# Altium footprint library HARTING THD.PcbLib: 113 footprints (part 8 of 11)
Each footprint in its own frame and in the unit in brackets; x right, y up, seen from the top. Pads: shape width x height; smd on the part's side, far side on the other; paste and mask are expansions set on the pad; w line width, h text height; cw(c..) or ccw(c..) is an arc to the next point about the centre after c.
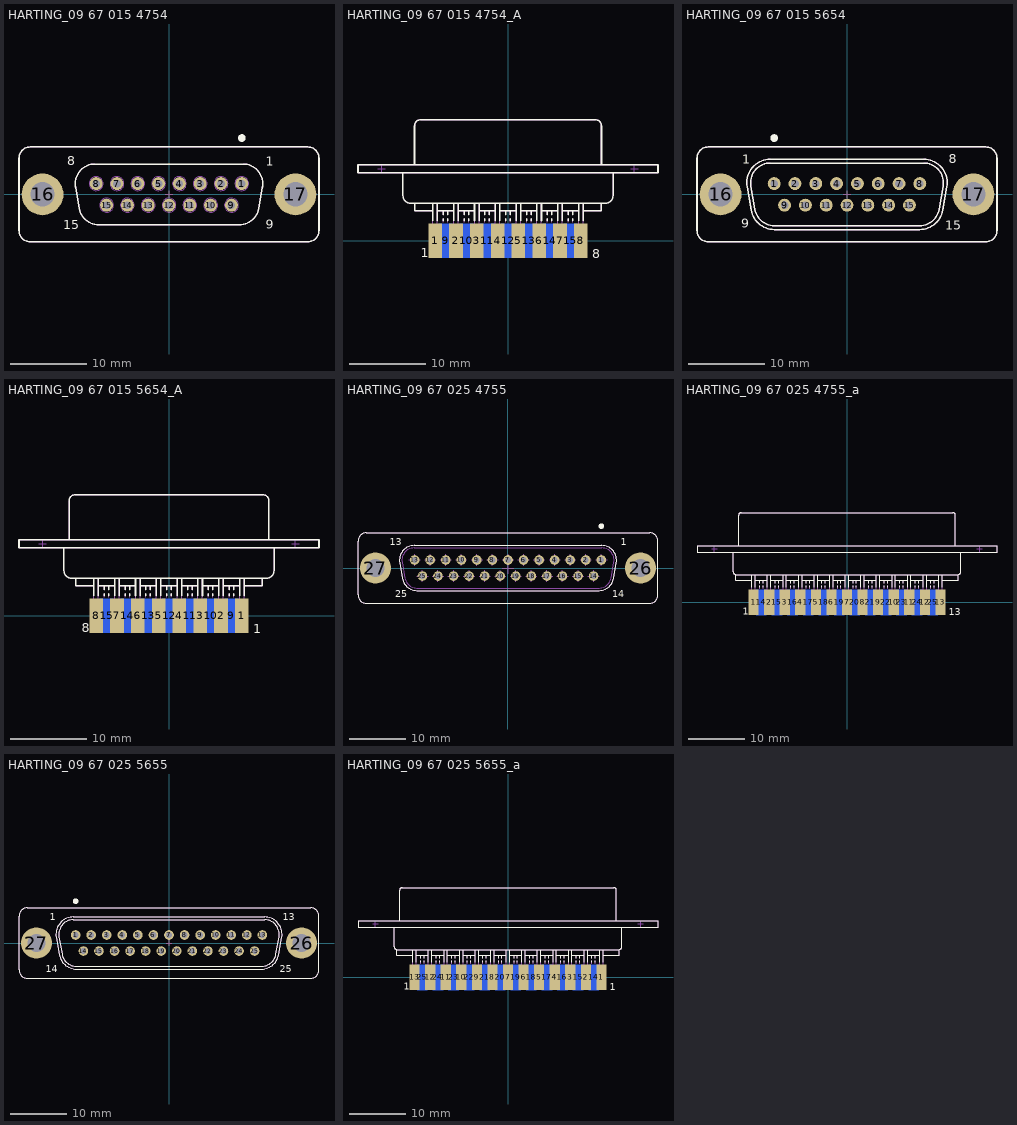
[diagram p7: the footprints below, top view; thin cyan lines are the x and y axes]

## HARTING_09 67 015 4754 [mm] "Straight D-SUB 15 Female Contacts"
height 12
pads (17):
  round 1.7 hole 1: 1(9.59,1.42) 2(6.85,1.42) 3(4.11,1.42) 4(1.37,1.42) 5(-1.37,1.42) 6(-4.11,1.42) 7(-6.85,1.42) 8(-9.59,1.42) 9(8.22,-1.42) 10(5.48,-1.42) 11(2.74,-1.42) 12(0,-1.42) 13(-2.74,-1.42) 14(-5.48,-1.42) 15(-8.22,-1.42)
  round 5.5 hole 3.2: 16(-16.65,0) 17(16.65,0)
Top Overlay:
  circle w0.5: c9.59,7.42 r0.25
  lines w0.2: -19.75,-4.75 ccw(c-18.25,-4.75) -18.25,-6.25 18.25,-6.25 ccw(c18.25,-4.75) 19.75,-4.75 19.75,4.75 ccw(c18.25,4.75) 18.25,6.25 -18.25,6.25 ccw(c-18.25,4.75) -19.75,4.75 -19.75,-4.75 ; -12.311,0.949 cw(c-9.75,1.4) -9.75,4 9.75,4 cw(c9.75,1.4) 12.311,0.949 11.817,-1.851 cw(c9.256,-1.4) 9.256,-4 -9.256,-4 cw(c-9.256,-1.4) -11.817,-1.851 -12.311,0.949
  text "15" at -13.9,-4.6 h1.2
  text "8" at -13.375,3.825 h1.2
  text "1" at 12.76,3.748 h1.2
  text "9" at 12.725,-4.55 h1.2
Mechanical 8:
  lines w0.1: -17.15,0 -16.65,0 ; -16.65,-0.5 -16.65,0 ; -16.65,0.5 -16.65,0 ; -16.15,0 -16.65,0 ; -10.09,1.42 -9.59,1.42 ; -9.59,0.92 -9.59,1.42 ; -9.59,1.92 -9.59,1.42 ; -9.09,1.42 -9.59,1.42 ; -8.72,-1.42 -8.22,-1.42 ; -8.22,-1.92 -8.22,-1.42 ; -8.22,-0.92 -8.22,-1.42 ; -7.72,-1.42 -8.22,-1.42 ; -7.35,1.42 -6.85,1.42 ; -6.85,0.92 -6.85,1.42 ; -6.85,1.92 -6.85,1.42 ; -6.35,1.42 -6.85,1.42 ; -5.98,-1.42 -5.48,-1.42 ; -5.48,-1.92 -5.48,-1.42 ; -5.48,-0.92 -5.48,-1.42 ; -4.98,-1.42 -5.48,-1.42 ; -4.61,1.42 -4.11,1.42 ; -4.11,0.92 -4.11,1.42 ; -4.11,1.92 -4.11,1.42 ; -3.61,1.42 -4.11,1.42 ; -3.24,-1.42 -2.74,-1.42 ; -2.74,-1.92 -2.74,-1.42 ; -2.74,-0.92 -2.74,-1.42 ; -2.24,-1.42 -2.74,-1.42 ; -1.87,1.42 -1.37,1.42 ; -1.37,0.92 -1.37,1.42 ; -1.37,1.92 -1.37,1.42 ; -0.87,1.42 -1.37,1.42 ; -0.5,-1.42 0,-1.42 ; -0.5,0 0,0 ; 0,-1.92 0,-1.42 ; 0,-0.92 0,-1.42 ; 0,-0.5 0,0 ; 0,0.5 0,0 ; 0.5,-1.42 0,-1.42 ; 0.5,0 0,0 ; 0.87,1.42 1.37,1.42 ; 1.37,0.92 1.37,1.42 ; 1.37,1.92 1.37,1.42 ; 1.87,1.42 1.37,1.42 ; 2.24,-1.42 2.74,-1.42 ; 2.74,-1.92 2.74,-1.42 ; 2.74,-0.92 2.74,-1.42 ; 3.24,-1.42 2.74,-1.42 ; 3.61,1.42 4.11,1.42 ; 4.11,0.92 4.11,1.42 ; 4.11,1.92 4.11,1.42 ; 4.61,1.42 4.11,1.42 ; 4.98,-1.42 5.48,-1.42 ; 5.48,-1.92 5.48,-1.42 ; 5.48,-0.92 5.48,-1.42 ; 5.98,-1.42 5.48,-1.42 ; 6.35,1.42 6.85,1.42 ; 6.85,0.92 6.85,1.42 ; 6.85,1.92 6.85,1.42 ; 7.35,1.42 6.85,1.42 ; 7.72,-1.42 8.22,-1.42 ; 8.22,-1.92 8.22,-1.42 ; 8.22,-0.92 8.22,-1.42 ; 8.72,-1.42 8.22,-1.42 ; 9.09,1.42 9.59,1.42 ; 9.59,0.92 9.59,1.42 ; 9.59,1.92 9.59,1.42 ; 10.09,1.42 9.59,1.42 ; 16.15,0 16.65,0 ; 16.65,-0.5 16.65,0 ; 16.65,0.5 16.65,0 ; 17.15,0 16.65,0
Mechanical 14:
  circle w0.1: c-8.22,-1.42 r0.55
  circle w0.1: c-5.48,-1.42 r0.55
  circle w0.1: c-2.74,-1.42 r0.55
  circle w0.1: c0,-1.42 r0.55
  circle w0.1: c2.74,-1.42 r0.55
  circle w0.1: c5.48,-1.42 r0.55
  circle w0.1: c8.22,-1.42 r0.55
  circle w0.1: c9.59,1.42 r0.55
  circle w0.1: c6.85,1.42 r0.55
  circle w0.1: c4.11,1.42 r0.55
  circle w0.1: c1.37,1.42 r0.55
  circle w0.1: c-1.37,1.42 r0.55
  circle w0.1: c-4.11,1.42 r0.55
  circle w0.1: c-6.85,1.42 r0.55
  circle w0.1: c-9.59,1.42 r0.55
  circle w0.1: c16.65,0 r1.55
  circle w0.1: c-16.65,0 r1.55
  circle w0.1: c-8.22,-1.42 r0.92
  circle w0.1: c-5.48,-1.42 r0.92
  circle w0.1: c-2.74,-1.42 r0.92
  circle w0.1: c0,-1.42 r0.92
  circle w0.1: c2.74,-1.42 r0.92
  circle w0.1: c5.48,-1.42 r0.92
  circle w0.1: c8.22,-1.42 r0.92
  circle w0.1: c9.59,1.42 r0.92
  circle w0.1: c6.85,1.42 r0.92
  circle w0.1: c4.11,1.42 r0.92
  circle w0.1: c1.37,1.42 r0.92
  circle w0.1: c-1.37,1.42 r0.92
  circle w0.1: c-4.11,1.42 r0.92
  circle w0.1: c-6.85,1.42 r0.92
  circle w0.1: c-9.59,1.42 r0.92
  lines w0.1: -19.75,-4.75 ccw(c-18.25,-4.75) -18.25,-6.25 18.25,-6.25 ccw(c18.25,-4.75) 19.75,-4.75 19.75,4.75 ccw(c18.25,4.75) 18.25,6.25 -18.25,6.25 ccw(c-18.25,4.75) -19.75,4.75 -19.75,-4.75 ; -12.311,0.949 cw(c-9.75,1.4) -9.75,4 9.75,4 cw(c9.75,1.4) 12.311,0.949 11.817,-1.851 cw(c9.256,-1.4) 9.256,-4 -9.256,-4 cw(c-9.256,-1.4) -11.817,-1.851 -12.311,0.949
  text "9" at 12.725,-4.55 h1.2
  text "1" at 12.76,3.748 h1.2
  text "8" at -13.375,3.825 h1.2
  text "15" at -13.9,-4.6 h1.2
3D body "HARTING_09 67 015 4754.stp": height 12, standoff -6, extent -19.75,-6.25 19.75,6.25

## HARTING_09 67 015 4754_A [mm] "PCB Edge Mounting Footprint For Straight D-SUB 15 Female Contacts"
height 6
pads (15):
  rect 1.8x4.5 smd paste-2.26: 1(-9.59,0) 2(-6.85,0) 3(-4.11,0) 4(-1.37,0) 5(1.37,0) 6(4.11,0) 7(6.85,0) 8(9.59,0)
  rect 1.8x4.5 smd far side paste-2.26: 9(-8.22,0) 10(-5.48,0) 11(-2.74,0) 12(0,0) 13(2.74,0) 14(5.48,0) 15(8.22,0)
Top Overlay:
  lines w0.2: -13.833,8.928 -13.833,5.928 ccw(c-12.833,5.928) -12.833,4.928 12.833,4.928 ccw(c12.833,5.928) 13.833,5.928 13.833,8.928 ; -12.311,10.028 -12.311,15.128 cw(c-11.511,15.128) -11.511,15.928 11.511,15.928 cw(c11.511,15.128) 12.311,15.128 12.311,10.028 ; -12.3,4.928 -12.3,3.928 -9.89,3.928 ; -9.89,2.65 -9.89,4.928 ; -9.29,2.65 -9.29,4.928 ; -9.29,3.928 -7.15,3.928 ; -8.52,2.65 -8.52,2.928 ; -8.52,3.428 -8.52,3.928 ; -7.92,2.65 -7.92,2.928 ; -7.92,3.428 -7.92,3.928 ; -7.15,2.65 -7.15,4.928 ; -6.55,2.65 -6.55,4.928 ; -6.55,3.928 -4.41,3.928 ; -5.78,2.65 -5.78,2.928 ; -5.78,3.428 -5.78,3.928 ; -5.18,2.65 -5.18,2.928 ; -5.18,3.428 -5.18,3.928 ; -4.41,2.65 -4.41,4.928 ; -3.81,2.65 -3.81,4.928 ; -3.81,3.928 -1.67,3.928 ; -3.04,2.65 -3.04,2.928 ; -3.04,3.428 -3.04,3.928 ; -2.44,2.65 -2.44,2.928 ; -2.44,3.428 -2.44,3.928 ; -1.67,2.65 -1.67,4.928 ; -1.07,2.65 -1.07,4.928 ; -1.07,3.928 1.07,3.928 ; -0.3,2.65 -0.3,2.928 ; -0.3,3.428 -0.3,3.928 ; 0.3,2.65 0.3,2.928 ; 0.3,3.428 0.3,3.928 ; 1.07,2.65 1.07,4.928 ; 1.67,2.65 1.67,4.928 ; 1.67,3.928 3.81,3.928 ; 2.44,2.65 2.44,2.928 ; 2.44,3.428 2.44,3.928 ; 3.04,2.65 3.04,2.928 ; 3.04,3.428 3.04,3.928 ; 3.81,2.65 3.81,4.928 ; 4.41,2.65 4.41,4.928 ; 4.41,3.928 6.55,3.928 ; 5.18,2.65 5.18,2.928 ; 5.18,3.428 5.18,3.928 ; 5.78,2.65 5.78,2.928 ; 5.78,3.428 5.78,3.928 ; 6.55,2.65 6.55,4.928 ; 7.15,2.65 7.15,4.928 ; 7.15,3.928 9.29,3.928 ; 7.92,2.65 7.92,2.928 ; 7.92,3.428 7.92,3.928 ; 8.52,2.65 8.52,2.928 ; 8.52,3.428 8.52,3.928 ; 9.29,2.65 9.29,4.928 ; 9.89,2.65 9.89,4.928 ; 9.89,3.928 12.3,3.928 12.3,4.928 ; -19.75,8.928 -19.75,10.028 19.75,10.028 19.75,8.928 -19.75,8.928
  text "1" at -11.5,-2.2 h1.2
  text "8" at 11.1,-2.3 h1.2
Bottom Overlay:
  lines w0.2: -13.833,8.928 -13.833,5.928 ccw(c-12.833,5.928) -12.833,4.928 12.833,4.928 ccw(c12.833,5.928) 13.833,5.928 13.833,8.928 ; -12.311,10.028 -12.311,15.128 cw(c-11.511,15.128) -11.511,15.928 11.511,15.928 cw(c11.511,15.128) 12.311,15.128 12.311,10.028 ; -12.3,4.928 -12.3,3.928 -8.52,3.928 ; -9.89,2.65 -9.89,2.928 ; -9.89,3.428 -9.89,3.928 ; -9.29,2.65 -9.29,2.928 ; -9.29,3.428 -9.29,3.928 ; -8.52,2.65 -8.52,4.928 ; -7.92,2.65 -7.92,4.928 ; -7.92,3.928 -5.78,3.928 ; -7.15,2.65 -7.15,2.928 ; -7.15,3.428 -7.15,3.928 ; -6.55,2.65 -6.55,2.928 ; -6.55,3.428 -6.55,3.928 ; -5.78,2.65 -5.78,4.928 ; -5.18,2.65 -5.18,4.928 ; -5.18,3.928 -3.04,3.928 ; -4.41,2.65 -4.41,2.928 ; -4.41,3.428 -4.41,3.928 ; -3.81,2.65 -3.81,2.928 ; -3.81,3.428 -3.81,3.928 ; -3.04,2.65 -3.04,4.928 ; -2.44,2.65 -2.44,4.928 ; -2.44,3.928 -0.3,3.928 ; -1.67,2.65 -1.67,2.928 ; -1.67,3.428 -1.67,3.928 ; -1.07,2.65 -1.07,2.928 ; -1.07,3.428 -1.07,3.928 ; -0.3,2.65 -0.3,4.928 ; 0.3,2.65 0.3,4.928 ; 0.3,3.928 2.44,3.928 ; 1.07,2.65 1.07,2.928 ; 1.07,3.428 1.07,3.928 ; 1.67,2.65 1.67,2.928 ; 1.67,3.428 1.67,3.928 ; 2.44,2.65 2.44,4.928 ; 3.04,2.65 3.04,4.928 ; 3.04,3.928 5.18,3.928 ; 3.81,2.65 3.81,2.928 ; 3.81,3.428 3.81,3.928 ; 4.41,2.65 4.41,2.928 ; 4.41,3.428 4.41,3.928 ; 5.18,2.65 5.18,4.928 ; 5.78,2.65 5.78,4.928 ; 5.78,3.928 7.92,3.928 ; 6.55,2.65 6.55,2.928 ; 6.55,3.428 6.55,3.928 ; 7.15,2.65 7.15,2.928 ; 7.15,3.428 7.15,3.928 ; 7.92,2.65 7.92,4.928 ; 8.52,2.65 8.52,4.928 ; 8.52,3.928 12.3,3.928 12.3,4.928 ; 9.29,2.65 9.29,2.928 ; 9.29,3.428 9.29,3.928 ; 9.89,2.65 9.89,2.928 ; 9.89,3.428 9.89,3.928 ; -19.75,8.928 -19.75,10.028 19.75,10.028 19.75,8.928 -19.75,8.928
  text "9" at -9.6,-2.2 h1.2
  text "15" at 11.3,-2.2 h1.2
Mechanical 8:
  lines w0.1: -17.15,9.478 -16.65,9.478 ; -16.65,8.928 -16.65,9.478 ; -16.65,10.028 -16.65,9.478 ; -16.15,9.478 -16.65,9.478 ; -10.09,0 -9.59,0 ; -9.59,-0.5 -9.59,0 ; -9.59,0.5 -9.59,0 ; -9.09,0 -9.59,0 ; -8.72,0 -8.22,0 ; -8.22,-0.5 -8.22,0 ; -8.22,0.5 -8.22,0 ; -7.72,0 -8.22,0 ; -7.35,0 -6.85,0 ; -6.85,-0.5 -6.85,0 ; -6.85,0.5 -6.85,0 ; -6.35,0 -6.85,0 ; -5.98,0 -5.48,0 ; -5.48,-0.5 -5.48,0 ; -5.48,0.5 -5.48,0 ; -4.98,0 -5.48,0 ; -4.61,0 -4.11,0 ; -4.11,-0.5 -4.11,0 ; -4.11,0.5 -4.11,0 ; -3.61,0 -4.11,0 ; -3.24,0 -2.74,0 ; -2.74,-0.5 -2.74,0 ; -2.74,0.5 -2.74,0 ; -2.24,0 -2.74,0 ; -1.87,0 -1.37,0 ; -1.37,-0.5 -1.37,0 ; -1.37,0.5 -1.37,0 ; -0.87,0 -1.37,0 ; -0.5,0 0,0 ; 0,-0.5 0,0 ; 0,0.5 0,0 ; 0.5,0 0,0 ; 0.87,0 1.37,0 ; 1.37,-0.5 1.37,0 ; 1.37,0.5 1.37,0 ; 1.87,0 1.37,0 ; 2.24,0 2.74,0 ; 2.74,-0.5 2.74,0 ; 2.74,0.5 2.74,0 ; 3.24,0 2.74,0 ; 3.61,0 4.11,0 ; 4.11,-0.5 4.11,0 ; 4.11,0.5 4.11,0 ; 4.61,0 4.11,0 ; 4.98,0 5.48,0 ; 5.48,-0.5 5.48,0 ; 5.48,0.5 5.48,0 ; 5.98,0 5.48,0 ; 6.35,0 6.85,0 ; 6.85,-0.5 6.85,0 ; 6.85,0.5 6.85,0 ; 7.35,0 6.85,0 ; 7.72,0 8.22,0 ; 8.22,-0.5 8.22,0 ; 8.22,0.5 8.22,0 ; 8.72,0 8.22,0 ; 9.09,0 9.59,0 ; 9.59,-0.5 9.59,0 ; 9.59,0.5 9.59,0 ; 10.09,0 9.59,0 ; 16.15,9.478 16.65,9.478 ; 16.65,8.928 16.65,9.478 ; 16.65,10.028 16.65,9.478 ; 17.15,9.478 16.65,9.478
Mechanical 14:
  drawing of 155 lines, arcs and shapes, not listed
  text "1" at -11.5,-2.2 h1.2
  text "8" at 11.1,-2.3 h1.2
3D body "HARTING_09 67 015 4754_a.stp": height 5.45, standoff -7.05, extent -19.75,-2.072 19.75,15.928

## HARTING_09 67 015 5654 [mm] "Straight D-SUB 15 Male Contacts"
height 12
pads (17):
  round 1.7 hole 1: 1(-9.59,1.42) 2(-6.85,1.42) 3(-4.11,1.42) 4(-1.37,1.42) 5(1.37,1.42) 6(4.11,1.42) 7(6.85,1.42) 8(9.59,1.42) 9(-8.22,-1.42) 10(-5.48,-1.42) 11(-2.74,-1.42) 12(0,-1.42) 13(2.74,-1.42) 14(5.48,-1.42) 15(8.22,-1.42)
  round 5.5 hole 3.2: 16(-16.65,0) 17(16.65,0)
Top Overlay:
  circle w0.5: c-9.59,7.42 r0.25
  lines w0.2: -19.75,-4.75 ccw(c-18.25,-4.75) -18.25,-6.25 18.25,-6.25 ccw(c18.25,-4.75) 19.75,-4.75 19.75,4.75 ccw(c18.25,4.75) 18.25,6.25 -18.25,6.25 ccw(c-18.25,4.75) -19.75,4.75 -19.75,-4.75 ; -13.153,0.987 cw(c-10.1,1.525) -10.1,4.625 10.1,4.625 cw(c10.1,1.525) 13.153,0.987 12.615,-2.063 cw(c9.562,-1.525) 9.562,-4.625 -9.562,-4.625 cw(c-9.562,-1.525) -12.615,-2.063 -13.153,0.987 ; -12.661,1.074 cw(c-10.1,1.525) -10.1,4.125 10.1,4.125 cw(c10.1,1.525) 12.661,1.074 12.123,-1.976 cw(c9.562,-1.525) 9.562,-4.125 -9.562,-4.125 cw(c-9.562,-1.525) -12.123,-1.976 -12.661,1.074
  text "9" at -13.95,-4.4 h1.2
  text "1" at -13.8,4.05 h1.2
  text "8" at 13.385,4.098 h1.2
  text "15" at 12.95,-4.65 h1.2
Mechanical 8:
  lines w0.1: -17.15,0 -16.65,0 ; -16.65,-0.5 -16.65,0 ; -16.65,0.5 -16.65,0 ; -16.15,0 -16.65,0 ; -10.09,1.42 -9.59,1.42 ; -9.59,0.92 -9.59,1.42 ; -9.59,1.92 -9.59,1.42 ; -9.09,1.42 -9.59,1.42 ; -8.72,-1.42 -8.22,-1.42 ; -8.22,-1.92 -8.22,-1.42 ; -8.22,-0.92 -8.22,-1.42 ; -7.72,-1.42 -8.22,-1.42 ; -7.35,1.42 -6.85,1.42 ; -6.85,0.92 -6.85,1.42 ; -6.85,1.92 -6.85,1.42 ; -6.35,1.42 -6.85,1.42 ; -5.98,-1.42 -5.48,-1.42 ; -5.48,-1.92 -5.48,-1.42 ; -5.48,-0.92 -5.48,-1.42 ; -4.98,-1.42 -5.48,-1.42 ; -4.61,1.42 -4.11,1.42 ; -4.11,0.92 -4.11,1.42 ; -4.11,1.92 -4.11,1.42 ; -3.61,1.42 -4.11,1.42 ; -3.24,-1.42 -2.74,-1.42 ; -2.74,-1.92 -2.74,-1.42 ; -2.74,-0.92 -2.74,-1.42 ; -2.24,-1.42 -2.74,-1.42 ; -1.87,1.42 -1.37,1.42 ; -1.37,0.92 -1.37,1.42 ; -1.37,1.92 -1.37,1.42 ; -0.87,1.42 -1.37,1.42 ; -0.5,-1.42 0,-1.42 ; -0.5,0 0,0 ; 0,-1.92 0,-1.42 ; 0,-0.92 0,-1.42 ; 0,-0.5 0,0 ; 0,0.5 0,0 ; 0.5,-1.42 0,-1.42 ; 0.5,0 0,0 ; 0.87,1.42 1.37,1.42 ; 1.37,0.92 1.37,1.42 ; 1.37,1.92 1.37,1.42 ; 1.87,1.42 1.37,1.42 ; 2.24,-1.42 2.74,-1.42 ; 2.74,-1.92 2.74,-1.42 ; 2.74,-0.92 2.74,-1.42 ; 3.24,-1.42 2.74,-1.42 ; 3.61,1.42 4.11,1.42 ; 4.11,0.92 4.11,1.42 ; 4.11,1.92 4.11,1.42 ; 4.61,1.42 4.11,1.42 ; 4.98,-1.42 5.48,-1.42 ; 5.48,-1.92 5.48,-1.42 ; 5.48,-0.92 5.48,-1.42 ; 5.98,-1.42 5.48,-1.42 ; 6.35,1.42 6.85,1.42 ; 6.85,0.92 6.85,1.42 ; 6.85,1.92 6.85,1.42 ; 7.35,1.42 6.85,1.42 ; 7.72,-1.42 8.22,-1.42 ; 8.22,-1.92 8.22,-1.42 ; 8.22,-0.92 8.22,-1.42 ; 8.72,-1.42 8.22,-1.42 ; 9.09,1.42 9.59,1.42 ; 9.59,0.92 9.59,1.42 ; 9.59,1.92 9.59,1.42 ; 10.09,1.42 9.59,1.42 ; 16.15,0 16.65,0 ; 16.65,-0.5 16.65,0 ; 16.65,0.5 16.65,0 ; 17.15,0 16.65,0
Mechanical 14:
  circle w0.1: c-16.65,0 r1.55
  circle w0.1: c16.65,0 r1.55
  circle w0.1: c-9.59,1.42 r0.55
  circle w0.1: c-6.85,1.42 r0.55
  circle w0.1: c-4.11,1.42 r0.55
  circle w0.1: c-1.37,1.42 r0.55
  circle w0.1: c1.37,1.42 r0.55
  circle w0.1: c4.11,1.42 r0.55
  circle w0.1: c6.85,1.42 r0.55
  circle w0.1: c9.59,1.42 r0.55
  circle w0.1: c8.22,-1.42 r0.55
  circle w0.1: c5.48,-1.42 r0.55
  circle w0.1: c2.74,-1.42 r0.55
  circle w0.1: c0,-1.42 r0.55
  circle w0.1: c-2.74,-1.42 r0.55
  circle w0.1: c-5.48,-1.42 r0.55
  circle w0.1: c-8.22,-1.42 r0.55
  lines w0.1: -19.75,-4.75 ccw(c-18.25,-4.75) -18.25,-6.25 18.25,-6.25 ccw(c18.25,-4.75) 19.75,-4.75 19.75,4.75 ccw(c18.25,4.75) 18.25,6.25 -18.25,6.25 ccw(c-18.25,4.75) -19.75,4.75 -19.75,-4.75 ; -13.153,0.987 cw(c-10.1,1.525) -10.1,4.625 10.1,4.625 cw(c10.1,1.525) 13.153,0.987 12.615,-2.063 cw(c9.562,-1.525) 9.562,-4.625 -9.562,-4.625 cw(c-9.562,-1.525) -12.615,-2.063 -13.153,0.987 ; -12.661,1.074 cw(c-10.1,1.525) -10.1,4.125 10.1,4.125 cw(c10.1,1.525) 12.661,1.074 12.123,-1.976 cw(c9.562,-1.525) 9.562,-4.125 -9.562,-4.125 cw(c-9.562,-1.525) -12.123,-1.976 -12.661,1.074
  text "15" at 12.95,-4.65 h1.2
  text "8" at 13.385,4.098 h1.2
  text "1" at -13.8,4.05 h1.2
  text "9" at -13.95,-4.4 h1.2
3D body "HARTING_09 67 015 5654.stp": height 12, standoff -6, extent -19.75,-6.25 19.75,6.25

## HARTING_09 67 015 5654_A [mm] "PCB Edge Mounting Footprint For Straight D-SUB 15 Male Contacts"
height 6
pads (15):
  rect 1.8x4.5 smd paste-2.26: 1(9.59,0) 2(6.85,0) 3(4.11,0) 4(1.37,0) 5(-1.37,0) 6(-4.11,0) 7(-6.85,0) 8(-9.59,0)
  rect 1.8x4.5 smd far side paste-2.26: 9(8.22,0) 10(5.48,0) 11(2.74,0) 12(0,0) 13(-2.74,0) 14(-5.48,0) 15(-8.22,0)
Top Overlay:
  lines w0.2: -13.833,8.928 -13.833,5.928 ccw(c-12.833,5.928) -12.833,4.928 12.833,4.928 ccw(c12.833,5.928) 13.833,5.928 13.833,8.928 ; -13.153,10.028 -13.153,15.128 cw(c-12.353,15.128) -12.353,15.928 12.353,15.928 cw(c12.353,15.128) 13.153,15.128 13.153,10.028 ; -12.3,4.928 -12.3,3.928 -9.89,3.928 ; -9.89,2.65 -9.89,4.928 ; -9.29,2.65 -9.29,4.928 ; -9.29,3.928 -7.15,3.928 ; -8.52,2.65 -8.52,2.928 ; -8.52,3.428 -8.52,3.928 ; -7.92,2.65 -7.92,2.928 ; -7.92,3.428 -7.92,3.928 ; -7.15,2.65 -7.15,4.928 ; -6.55,2.65 -6.55,4.928 ; -6.55,3.928 -4.41,3.928 ; -5.78,2.65 -5.78,2.928 ; -5.78,3.428 -5.78,3.928 ; -5.18,2.65 -5.18,2.928 ; -5.18,3.428 -5.18,3.928 ; -4.41,2.65 -4.41,4.928 ; -3.81,2.65 -3.81,4.928 ; -3.81,3.928 -1.67,3.928 ; -3.04,2.65 -3.04,2.928 ; -3.04,3.428 -3.04,3.928 ; -2.44,2.65 -2.44,2.928 ; -2.44,3.428 -2.44,3.928 ; -1.67,2.65 -1.67,4.928 ; -1.07,2.65 -1.07,4.928 ; -1.07,3.928 1.07,3.928 ; -0.3,2.65 -0.3,2.928 ; -0.3,3.428 -0.3,3.928 ; 0.3,2.65 0.3,2.928 ; 0.3,3.428 0.3,3.928 ; 1.07,2.65 1.07,4.928 ; 1.67,2.65 1.67,4.928 ; 1.67,3.928 3.81,3.928 ; 2.44,2.65 2.44,2.928 ; 2.44,3.428 2.44,3.928 ; 3.04,2.65 3.04,2.928 ; 3.04,3.428 3.04,3.928 ; 3.81,2.65 3.81,4.928 ; 4.41,2.65 4.41,4.928 ; 4.41,3.928 6.55,3.928 ; 5.18,2.65 5.18,2.928 ; 5.18,3.428 5.18,3.928 ; 5.78,2.65 5.78,2.928 ; 5.78,3.428 5.78,3.928 ; 6.55,2.65 6.55,4.928 ; 7.15,2.65 7.15,4.928 ; 7.15,3.928 9.29,3.928 ; 7.92,2.65 7.92,2.928 ; 7.92,3.428 7.92,3.928 ; 8.52,2.65 8.52,2.928 ; 8.52,3.428 8.52,3.928 ; 9.29,2.65 9.29,4.928 ; 9.89,2.65 9.89,4.928 ; 9.89,3.928 12.3,3.928 12.3,4.928 ; -19.75,8.928 -19.75,10.028 19.75,10.028 19.75,8.928 -19.75,8.928
  text "8" at -11.5,-2.2 h1.2
  text "1" at 11.1,-2.3 h1.2
Bottom Overlay:
  lines w0.2: -13.833,8.928 -13.833,5.928 ccw(c-12.833,5.928) -12.833,4.928 12.833,4.928 ccw(c12.833,5.928) 13.833,5.928 13.833,8.928 ; -13.153,10.028 -13.153,15.128 cw(c-12.353,15.128) -12.353,15.928 12.353,15.928 cw(c12.353,15.128) 13.153,15.128 13.153,10.028 ; -12.3,4.928 -12.3,3.928 -8.52,3.928 ; -9.89,2.65 -9.89,2.928 ; -9.89,3.428 -9.89,3.928 ; -9.29,2.65 -9.29,2.928 ; -9.29,3.428 -9.29,3.928 ; -8.52,2.65 -8.52,4.928 ; -7.92,2.65 -7.92,4.928 ; -7.92,3.928 -5.78,3.928 ; -7.15,2.65 -7.15,2.928 ; -7.15,3.428 -7.15,3.928 ; -6.55,2.65 -6.55,2.928 ; -6.55,3.428 -6.55,3.928 ; -5.78,2.65 -5.78,4.928 ; -5.18,2.65 -5.18,4.928 ; -5.18,3.928 -3.04,3.928 ; -4.41,2.65 -4.41,2.928 ; -4.41,3.428 -4.41,3.928 ; -3.81,2.65 -3.81,2.928 ; -3.81,3.428 -3.81,3.928 ; -3.04,2.65 -3.04,4.928 ; -2.44,2.65 -2.44,4.928 ; -2.44,3.928 -0.3,3.928 ; -1.67,2.65 -1.67,2.928 ; -1.67,3.428 -1.67,3.928 ; -1.07,2.65 -1.07,2.928 ; -1.07,3.428 -1.07,3.928 ; -0.3,2.65 -0.3,4.928 ; 0.3,2.65 0.3,4.928 ; 0.3,3.928 2.44,3.928 ; 1.07,2.65 1.07,2.928 ; 1.07,3.428 1.07,3.928 ; 1.67,2.65 1.67,2.928 ; 1.67,3.428 1.67,3.928 ; 2.44,2.65 2.44,4.928 ; 3.04,2.65 3.04,4.928 ; 3.04,3.928 5.18,3.928 ; 3.81,2.65 3.81,2.928 ; 3.81,3.428 3.81,3.928 ; 4.41,2.65 4.41,2.928 ; 4.41,3.428 4.41,3.928 ; 5.18,2.65 5.18,4.928 ; 5.78,2.65 5.78,4.928 ; 5.78,3.928 7.92,3.928 ; 6.55,2.65 6.55,2.928 ; 6.55,3.428 6.55,3.928 ; 7.15,2.65 7.15,2.928 ; 7.15,3.428 7.15,3.928 ; 7.92,2.65 7.92,4.928 ; 8.52,2.65 8.52,4.928 ; 8.52,3.928 12.3,3.928 12.3,4.928 ; 9.29,2.65 9.29,2.928 ; 9.29,3.428 9.29,3.928 ; 9.89,2.65 9.89,2.928 ; 9.89,3.428 9.89,3.928 ; -19.75,8.928 -19.75,10.028 19.75,10.028 19.75,8.928 -19.75,8.928
  text "15" at -9.6,-2.2 h1.2
  text "9" at 10.4,-2.2 h1.2
Mechanical 8:
  lines w0.1: -17.15,9.478 -16.65,9.478 ; -16.65,8.928 -16.65,9.478 ; -16.65,10.028 -16.65,9.478 ; -16.15,9.478 -16.65,9.478 ; -10.09,0 -9.59,0 ; -9.59,-0.5 -9.59,0 ; -9.59,0.5 -9.59,0 ; -9.09,0 -9.59,0 ; -8.72,0 -8.22,0 ; -8.22,-0.5 -8.22,0 ; -8.22,0.5 -8.22,0 ; -7.72,0 -8.22,0 ; -7.35,0 -6.85,0 ; -6.85,-0.5 -6.85,0 ; -6.85,0.5 -6.85,0 ; -6.35,0 -6.85,0 ; -5.98,0 -5.48,0 ; -5.48,-0.5 -5.48,0 ; -5.48,0.5 -5.48,0 ; -4.98,0 -5.48,0 ; -4.61,0 -4.11,0 ; -4.11,-0.5 -4.11,0 ; -4.11,0.5 -4.11,0 ; -3.61,0 -4.11,0 ; -3.24,0 -2.74,0 ; -2.74,-0.5 -2.74,0 ; -2.74,0.5 -2.74,0 ; -2.24,0 -2.74,0 ; -1.87,0 -1.37,0 ; -1.37,-0.5 -1.37,0 ; -1.37,0.5 -1.37,0 ; -0.87,0 -1.37,0 ; -0.5,0 0,0 ; 0,-0.5 0,0 ; 0,0.5 0,0 ; 0.5,0 0,0 ; 0.87,0 1.37,0 ; 1.37,-0.5 1.37,0 ; 1.37,0.5 1.37,0 ; 1.87,0 1.37,0 ; 2.24,0 2.74,0 ; 2.74,-0.5 2.74,0 ; 2.74,0.5 2.74,0 ; 3.24,0 2.74,0 ; 3.61,0 4.11,0 ; 4.11,-0.5 4.11,0 ; 4.11,0.5 4.11,0 ; 4.61,0 4.11,0 ; 4.98,0 5.48,0 ; 5.48,-0.5 5.48,0 ; 5.48,0.5 5.48,0 ; 5.98,0 5.48,0 ; 6.35,0 6.85,0 ; 6.85,-0.5 6.85,0 ; 6.85,0.5 6.85,0 ; 7.35,0 6.85,0 ; 7.72,0 8.22,0 ; 8.22,-0.5 8.22,0 ; 8.22,0.5 8.22,0 ; 8.72,0 8.22,0 ; 9.09,0 9.59,0 ; 9.59,-0.5 9.59,0 ; 9.59,0.5 9.59,0 ; 10.09,0 9.59,0 ; 16.15,9.478 16.65,9.478 ; 16.65,8.928 16.65,9.478 ; 16.65,10.028 16.65,9.478 ; 17.15,9.478 16.65,9.478
Mechanical 14:
  drawing of 155 lines, arcs and shapes, not listed
  text "8" at -11.5,-2.2 h1.2
  text "1" at 11.1,-2.3 h1.2
3D body "HARTING_09 67 015 5654_a.stp": height 5.45, standoff -7.05, extent -19.75,-2.072 19.75,15.928

## HARTING_09 67 025 4755 [mm] "Straight D-Sub 25 Female Contacts with Turned Soder Contacts and Hole"
height 12.3
pads (27):
  round 1.7 hole 1: 1(16.56,1.42) 2(13.8,1.42) 3(11.04,1.42) 4(8.28,1.42) 5(5.52,1.42) 6(2.76,1.42) 7(0,1.42) 8(-2.76,1.42) 9(-5.52,1.42) 10(-8.28,1.42) 11(-11.04,1.42) 12(-13.8,1.42) 13(-16.56,1.42) 14(15.18,-1.42) 15(12.42,-1.42) 16(9.66,-1.42) 17(6.9,-1.42) 18(4.14,-1.42) 19(1.38,-1.42) 20(-1.38,-1.42) 21(-4.14,-1.42) 22(-6.9,-1.42) 23(-9.66,-1.42) 24(-12.42,-1.42) 25(-15.18,-1.42)
  round 5.5 hole 3.2: 26(23.5,0) 27(-23.5,0)
Top Overlay:
  circle w0.5: c16.56,7.42 r0.25
  lines w0.2: -26.6,-4.75 ccw(c-25.1,-4.75) -25.1,-6.25 25.1,-6.25 ccw(c25.1,-4.75) 26.6,-4.75 26.6,4.75 ccw(c25.1,4.75) 25.1,6.25 -25.1,6.25 ccw(c-25.1,4.75) -26.6,4.75 -26.6,-4.75 ; -19.215,0.949 cw(c-16.655,1.4) -16.655,4 16.655,4 cw(c16.655,1.4) 19.216,0.949 18.722,-1.851 cw(c16.161,-1.4) 16.161,-4 -16.161,-4 cw(c-16.161,-1.4) -18.722,-1.851 -19.215,0.949
  text "1" at 20,4 h1.2
  text "25" at -20,-5.2 h1.2
  text "13" at -21,4 h1.2
  text "14" at 18.5,-5.2 h1.2
Mechanical 8:
  lines w0.1: -24.5,0 -23.5,0 ; -23.5,-1 -23.5,0 ; -23.5,1 -23.5,0 ; -22.5,0 -23.5,0 ; -17.56,1.42 -16.56,1.42 ; -16.56,0.42 -16.56,1.42 ; -16.56,2.42 -16.56,1.42 ; -16.18,-1.42 -15.18,-1.42 ; -15.56,1.42 -16.56,1.42 ; -15.18,-2.42 -15.18,-1.42 ; -15.18,-0.42 -15.18,-1.42 ; -14.8,1.42 -13.8,1.42 ; -14.18,-1.42 -15.18,-1.42 ; -13.8,0.42 -13.8,1.42 ; -13.8,2.42 -13.8,1.42 ; -13.42,-1.42 -12.42,-1.42 ; -12.8,1.42 -13.8,1.42 ; -12.42,-2.42 -12.42,-1.42 ; -12.42,-0.42 -12.42,-1.42 ; -12.04,1.42 -11.04,1.42 ; -11.42,-1.42 -12.42,-1.42 ; -11.04,0.42 -11.04,1.42 ; -11.04,2.42 -11.04,1.42 ; -10.66,-1.42 -9.66,-1.42 ; -10.04,1.42 -11.04,1.42 ; -9.66,-2.42 -9.66,-1.42 ; -9.66,-0.42 -9.66,-1.42 ; -9.28,1.42 -8.28,1.42 ; -8.66,-1.42 -9.66,-1.42 ; -8.28,0.42 -8.28,1.42 ; -8.28,2.42 -8.28,1.42 ; -7.9,-1.42 -6.9,-1.42 ; -7.28,1.42 -8.28,1.42 ; -6.9,-2.42 -6.9,-1.42 ; -6.9,-0.42 -6.9,-1.42 ; -6.52,1.42 -5.52,1.42 ; -5.9,-1.42 -6.9,-1.42 ; -5.52,0.42 -5.52,1.42 ; -5.52,2.42 -5.52,1.42 ; -5.14,-1.42 -4.14,-1.42 ; -4.52,1.42 -5.52,1.42 ; -4.14,-2.42 -4.14,-1.42 ; -4.14,-0.42 -4.14,-1.42 ; -3.76,1.42 -2.76,1.42 ; -3.14,-1.42 -4.14,-1.42 ; -2.76,0.42 -2.76,1.42 ; -2.76,2.42 -2.76,1.42 ; -2.38,-1.42 -1.38,-1.42 ; -1.76,1.42 -2.76,1.42 ; -1.38,-2.42 -1.38,-1.42 ; -1.38,-0.42 -1.38,-1.42 ; -1,0 0,0 ; -1,1.42 0,1.42 ; -0.5,0 0,0 ; -0.38,-1.42 -1.38,-1.42 ; 0,-1 0,0 ; 0,-0.5 0,0 ; 0,0.42 0,1.42 ; 0,0.5 0,0 ; 0,1 0,0 ; 0,2.42 0,1.42 ; 0.38,-1.42 1.38,-1.42 ; 0.5,0 0,0 ; 1,0 0,0 ; 1,1.42 0,1.42 ; 1.38,-2.42 1.38,-1.42 ; 1.38,-0.42 1.38,-1.42 ; 1.76,1.42 2.76,1.42 ; 2.38,-1.42 1.38,-1.42 ; 2.76,0.42 2.76,1.42 ; 2.76,2.42 2.76,1.42 ; 3.14,-1.42 4.14,-1.42 ; 3.76,1.42 2.76,1.42 ; 4.14,-2.42 4.14,-1.42 ; 4.14,-0.42 4.14,-1.42 ; 4.52,1.42 5.52,1.42 ; 5.14,-1.42 4.14,-1.42 ; 5.52,0.42 5.52,1.42 ; 5.52,2.42 5.52,1.42 ; 5.9,-1.42 6.9,-1.42 ; 6.52,1.42 5.52,1.42 ; 6.9,-2.42 6.9,-1.42 ; 6.9,-0.42 6.9,-1.42 ; 7.28,1.42 8.28,1.42 ; 7.9,-1.42 6.9,-1.42 ; 8.28,0.42 8.28,1.42 ; 8.28,2.42 8.28,1.42 ; 8.66,-1.42 9.66,-1.42 ; 9.28,1.42 8.28,1.42 ; 9.66,-2.42 9.66,-1.42 ; 9.66,-0.42 9.66,-1.42 ; 10.04,1.42 11.04,1.42 ; 10.66,-1.42 9.66,-1.42 ; 11.04,0.42 11.04,1.42 ; 11.04,2.42 11.04,1.42 ; 11.42,-1.42 12.42,-1.42 ; 12.04,1.42 11.04,1.42 ; 12.42,-2.42 12.42,-1.42 ; 12.42,-0.42 12.42,-1.42 ; 12.8,1.42 13.8,1.42 ; 13.42,-1.42 12.42,-1.42 ; 13.8,0.42 13.8,1.42 ; 13.8,2.42 13.8,1.42 ; 14.18,-1.42 15.18,-1.42 ; 14.8,1.42 13.8,1.42 ; 15.18,-2.42 15.18,-1.42 ; 15.18,-0.42 15.18,-1.42 ; 15.56,1.42 16.56,1.42 ; 16.18,-1.42 15.18,-1.42 ; 16.56,0.42 16.56,1.42 ; 16.56,2.42 16.56,1.42 ; 17.56,1.42 16.56,1.42 ; 22.5,0 23.5,0 ; 23.5,-1 23.5,0 ; 23.5,1 23.5,0 ; 24.5,0 23.5,0